# Altium footprint library General.PCBLIB: 130 footprints (part 5 of 9)
Each footprint in its own frame and in the unit in brackets; x right, y up, seen from the top. Pads: shape width x height; smd on the part's side, far side on the other; paste and mask are expansions set on the pad; w line width, h text height; cw(c..) or ccw(c..) is an arc to the next point about the centre after c.
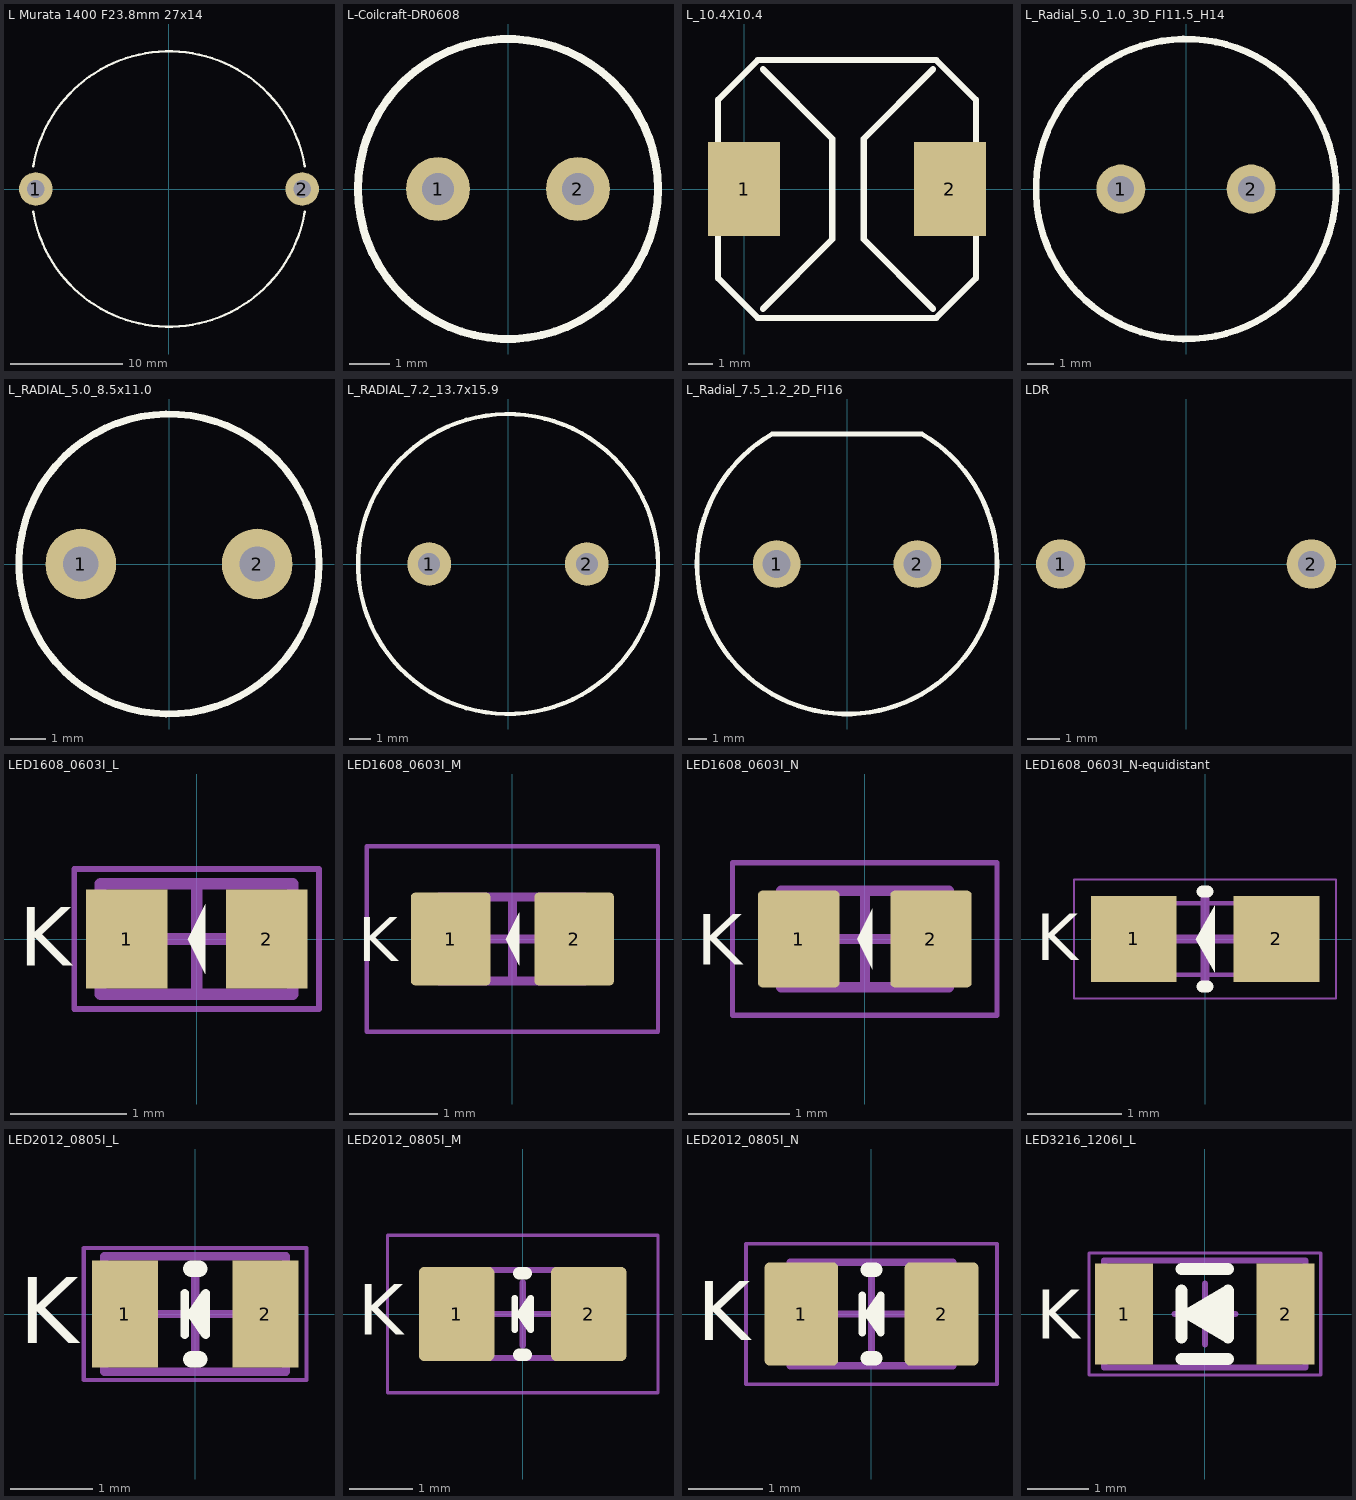
[diagram p4: the footprints below, top view; thin cyan lines are the x and y axes]

## L Murata 1400 F23.8mm 27x14 [mm]
height 15
pads (2):
  round 3 hole 1.6: 1(-11.9,0) 2(11.9,0)
Top Overlay:
  lines w0.2: -12.133,-2.022 ccw(c0,0) 12.133,-2.022 ; -12.133,2.022 cw(c0,0) 12.133,2.022
Top DesignatorDoc:
  text ".Designator" at 0,0 h1.2
3D body "User Library-murata_1400.step": height 14.51, standoff -9.99, extent -12.65,-12.2 12.65,12.2

## L-Coilcraft-DR0608 [mm]
height 15.9
pads (2):
  round 1.6 hole 0.8: 1(-1.75,0) 2(1.75,0)
Top Overlay:
  circle w0.2: c0,0 r3.75
Top DesignatorDoc:
  text ".Designator" at 0,0 h1.2
3D body "Coilcraft-DR0608.step": height 9.71, standoff -4.79, extent -3.75,-3.75 3.75,3.75

## L_10.4X10.4 [mm]
pads (2):
  rect 2.9x3.8 smd: 1(0,0) 2(8.3,0)
Top Overlay:
  lines w0.254: 0.762,-4.826 3.556,-2.032 3.556,2.032 0.762,4.826 ; 7.62,-4.826 4.826,-2.032 4.826,2.032 7.62,4.826 ; -1.05,-3.6 -1.05,3.6 0.55,5.2 7.75,5.2 9.35,3.6 9.35,-3.6 7.75,-5.2 0.55,-5.2 -1.05,-3.6
Top DesignatorDoc:
  text ".Designator" at 4.191,0 h1.2
3D body "WE-PD_1030_Metal.stp": height 2.8, standoff 0.05, extent -0.838,-5 9.162,5

## L_Radial_5.0_1.0_3D_FI11.5_H14 [mm]
pads (2):
  round 1.88 hole 1: 1(-2.5,0) 2(2.5,0)
Top Overlay:
  circle w0.254: c0,0 r5.75
Top DesignatorDoc:
  text ".Designator" at 0,0 h1.2
3D body "Coilcraft-DR0810-DEFAULT.step": height 11.52, standoff -4.48, extent -5.25,-5.293 5.25,5.207

## L_RADIAL_5.0_8.5x11.0 [mm]
pads (2):
  round 2 hole 1: 1(-2.5,0) 2(2.5,0)
Top Overlay:
  circle w0.2: c0,0 r4.25
Top DesignatorDoc:
  text ".Designator" at 0,0 h1.2
3D body: height 11.1, standoff 0.1, extent -4.25,-4.25 4.25,4.25

## L_RADIAL_7.2_13.7x15.9 [mm]
height 15.9
pads (2):
  round 2 hole 1: 1(-3.6,0) 2(3.6,0)
Top Overlay:
  circle w0.2: c0,0 r6.85
Top DesignatorDoc:
  text ".Designator" at 0,0 h1.2
3D body: height 16, standoff 0.1, extent -6.85,-6.847 6.85,6.847

## L_Radial_7.5_1.2_2D_FI16 [mm]
height 23
pads (2):
  round 2.54 hole 1.5: 1(-3.75,0) 2(3.75,0)
Top Overlay:
  lines w0.254: -4,6.928 ccw(c0,0) 4,6.928 -4,6.928
Top DesignatorDoc:
  text ".Designator" at 0,0 h1.2
3D body: height 23, standoff 0, extent -8.001,-8.001 8.001,6.929

## LDR [mm]
pads (2):
  round 1.5 hole 0.8: 1(-3.81,0) 2(3.81,0)
Top DesignatorDoc:
  text ".Designator" at 0,0 h1.2
3D body "User Library-PDV-P5001.STEP": height 19.44, standoff -19.44, extent -5.625,-4.775 5.625,4.775

## LED1608_0603I_L [mm] "SMD LED, 2-Leads, Body 1.57x0.85mm, IPC High Density"
height 0.5
pads (2):
  rect 0.7x0.85 smd: 1(-0.6,0) 2(0.6,0)
Top Overlay:
  region: 0.075,0.3 -0.075,0 0.075,-0.3
  text "K" at -1.524,-0.229 h0.5
Top Body, 3D Models:
  lines w0.1: -0.825,-0.475 -0.825,0.475 0.825,0.475 0.825,-0.475 -0.825,-0.475
Top Courtyard:
  lines w0.05: -1.05,-0.6 -1.05,0.6 1.05,0.6 1.05,-0.6 -1.05,-0.6
  lines w0.1: -0.475,0 0.475,0 ; 0,-0.475 0,0.475
Top DesignatorDoc:
  text ".Designator" at 0,0 h1.2
3D body "STEP-WL-SMCW-0603-rev1.stp": height 0.7, standoff 0, extent -0.8,-0.4 0.8,0.4

## LED1608_0603I_M [mm] "SMD LED, 2-Leads, Body 1.57x0.85mm, IPC Low Density"
height 0.5
pads (2):
  rrect10% 0.9x1.05 smd: 1(-0.7,0) 2(0.7,0)
Top Overlay:
  region: 0.075,0.3 -0.075,0 0.075,-0.3
  text "K" at -1.75,-0.25 h0.5
Top Body, 3D Models:
  lines w0.1: -0.825,-0.475 -0.825,0.475 0.825,0.475 0.825,-0.475 -0.825,-0.475
Top Courtyard:
  lines w0.05: -1.65,-1.05 -1.65,1.05 1.65,1.05 1.65,-1.05 -1.65,-1.05
  lines w0.1: -0.475,0 0.475,0 ; 0,-0.475 0,0.475
Top DesignatorDoc:
  text ".Designator" at 0,0 h1.2
3D body "STEP-WL-SMCW-0603-rev1.stp": height 0.7, standoff 0, extent -0.8,-0.4 0.8,0.4

## LED1608_0603I_N [mm] "SMD LED, 2-Leads, Body 1.57x0.85mm, IPC Medium Density"
height 0.5
pads (2):
  rrect10% 0.8x0.95 smd: 1(-0.65,0) 2(0.65,0)
Top Overlay:
  region: 0.075,0.3 -0.075,0 0.075,-0.3
  text "K" at -1.651,-0.254 h0.5
Top Body, 3D Models:
  lines w0.1: -0.825,-0.475 -0.825,0.475 0.825,0.475 0.825,-0.475 -0.825,-0.475
Top Courtyard:
  lines w0.05: -1.3,-0.75 -1.3,0.75 1.3,0.75 1.3,-0.75 -1.3,-0.75
  lines w0.1: -0.475,0 0.475,0 ; 0,-0.475 0,0.475
Top DesignatorDoc:
  text ".Designator" at 0,0 h1.2
3D body "STEP-WL-SMCW-0603-rev1.stp": height 0.7, standoff 0, extent -0.8,-0.4 0.8,0.4

## LED1608_0603I_N-equidistant [mil] "SMD LED, 2-Leads, Body 1.57x0.85mm, IPC Medium Density"
height 19.68
pads (2):
  rect 36x36 smd: 1(-30,0.01) 2(30,0.01)
Top Overlay:
  region: 4,13.91 -4,0 4,-13.91
  lines w5: -1,-20 1,-20 ; -1,20 1,20
  text "K" at -71,-9 h19.68
Top Body, 3D Models:
  lines w2: -30,-15 30,-15 30,15 -30,15 -30,-15
Top Courtyard:
  lines w0.79: -55,-25 -55,25 55,25 55,-25 -55,-25
  lines w3.94: -18.7,0 18.7,0 ; 0,-18.7 0,18.7
Top DesignatorDoc:
  text ".Designator" at 0,0 h47.24
3D body "STEP-WL-SMCW-0603-rev1.stp": height 27.56, standoff 0, extent -31.49,-15.74 31.5,15.75

## LED2012_0805I_L [mm] "SMD LED, 2-Leads, Body 2.05x1.25mm, IPC High Density"
height 0.8
pads (2):
  rect 0.8x1.3 smd: 1(-0.85,0) 2(0.85,0)
Top Overlay:
  region: 0.127,-0.254 0.127,0.254 -0.127,0
  lines w0.1: -0.127,-0.254 -0.127,0.254 ; -0.051,0 0.127,0.254 0.127,-0.254 -0.051,0
  lines w0.2: -0.05,-0.55 0.05,-0.55 ; -0.05,0.55 0.05,0.55
  text "K" at -2.134,-0.356 h0.8
Top Body, 3D Models:
  lines w0.1: -1.1,-0.7 1.1,-0.7 1.1,0.7 -1.1,0.7 -1.1,-0.7
Top Courtyard:
  lines w0.05: -1.35,-0.8 1.35,-0.8 1.35,0.8 -1.35,0.8 -1.35,-0.8
  lines w0.1: -0.5,0 0.5,0 ; 0,-0.5 0,0.5
Top DesignatorDoc:
  text ".Designator" at 0,0 h1.2
3D body "STEP-WL-SMCW-0805-rev1.stp": height 0.7, standoff 0, extent -1,-0.625 1,0.625

## LED2012_0805I_M [mm] "SMD LED, 2-Leads, Body 2.05x1.25mm, IPC Low Density"
height 0.8
pads (2):
  rrect15% 1.2x1.5 smd: 1(-1.05,0) 2(1.05,0)
Top Overlay:
  region: 0.127,-0.254 0.127,0.254 -0.127,0
  lines w0.1: -0.127,-0.254 -0.127,0.254 ; -0.051,0 0.127,-0.254 0.127,0.254 -0.051,0
  lines w0.2: -0.05,-0.65 0.05,-0.65 ; -0.05,0.65 0.05,0.65
  text "K" at -2.616,-0.33 h0.8
Top Body, 3D Models:
  lines w0.1: -1.1,-0.7 1.1,-0.7 1.1,0.7 -1.1,0.7 -1.1,-0.7
Top Courtyard:
  lines w0.05: -2.15,-1.25 2.15,-1.25 2.15,1.25 -2.15,1.25 -2.15,-1.25
  lines w0.1: -0.5,0 0.5,0 ; 0,-0.5 0,0.5
Top DesignatorDoc:
  text ".Designator" at 0,0 h1.2
3D body "STEP-WL-SMCW-0805-rev1.stp": height 0.7, standoff 0, extent -1,-0.625 1,0.625

## LED2012_0805I_N [mm] "SMD LED, 2-Leads, Body 2.05x1.25mm, IPC Medium Density"
height 0.8
pads (2):
  rrect15% 1x1.4 smd: 1(-0.95,0) 2(0.95,0)
Top Overlay:
  region: 0.127,-0.254 0.127,0.254 -0.127,0
  lines w0.1: -0.127,-0.254 -0.127,0.254 ; -0.051,0 0.127,-0.254 0.127,0.254 -0.051,0
  lines w0.2: -0.05,-0.6 0.05,-0.6 ; -0.05,0.6 0.05,0.6
  text "K" at -2.362,-0.356 h0.8
Top Body, 3D Models:
  lines w0.1: -1.1,-0.7 -1.1,0.7 1.1,0.7 1.1,-0.7 -1.1,-0.7
Top Courtyard:
  lines w0.05: -1.7,-0.95 -1.7,0.95 1.7,0.95 1.7,-0.95 -1.7,-0.95
  lines w0.1: -0.5,0 0.5,0 ; 0,-0.5 0,0.5
Top DesignatorDoc:
  text ".Designator" at 0,0 h1.2
3D body "STEP-WL-SMCW-0805-rev1.stp": height 0.7, standoff 0, extent -1,-0.625 1,0.625

## LED3216_1206I_L [mm] "SMD LED, 2-Leads, Body 3.15x1.60mm, IPC High Density"
height 0.6
pads (2):
  rect 0.95x1.65 smd: 1(-1.325,0) 2(1.325,0)
Top Overlay:
  region: 0.381,-0.381 0.381,0.381 -0.381,0
  lines w0.1: 0.127,-0.254 -0.051,0 0.127,0.254
  lines w0.2: -0.381,-0.737 0.381,-0.737 ; -0.381,-0.381 -0.381,0.381 ; -0.381,0.737 0.381,0.737 ; -0.254,0 0.381,0.381 0.381,-0.381 -0.254,0
  text "K" at -2.769,-0.406 h0.8
Top Body, 3D Models:
  lines w0.1: -1.65,-0.875 -1.65,0.875 1.65,0.875 1.65,-0.875 -1.65,-0.875
Top Courtyard:
  lines w0.05: -1.9,-1 -1.9,1 1.9,1 1.9,-1 -1.9,-1
  lines w0.1: -0.5,0 0.5,0 ; 0,-0.5 0,0.5
Top DesignatorDoc:
  text ".Designator" at 0,0 h1.2
3D body "STEP-WL-SMCW-1206-rev1.stp": height 0.68, standoff 0, extent -1.6,-0.8 1.6,0.8